# Altium footprint library ESPMODULE.PcbLib: 6 footprints
Each footprint in its own frame and in the unit in brackets; x right, y up, seen from the top. Pads: shape width x height; smd on the part's side, far side on the other; paste and mask are expansions set on the pad; w line width, h text height; cw(c..) or ccw(c..) is an arc to the next point about the centre after c.
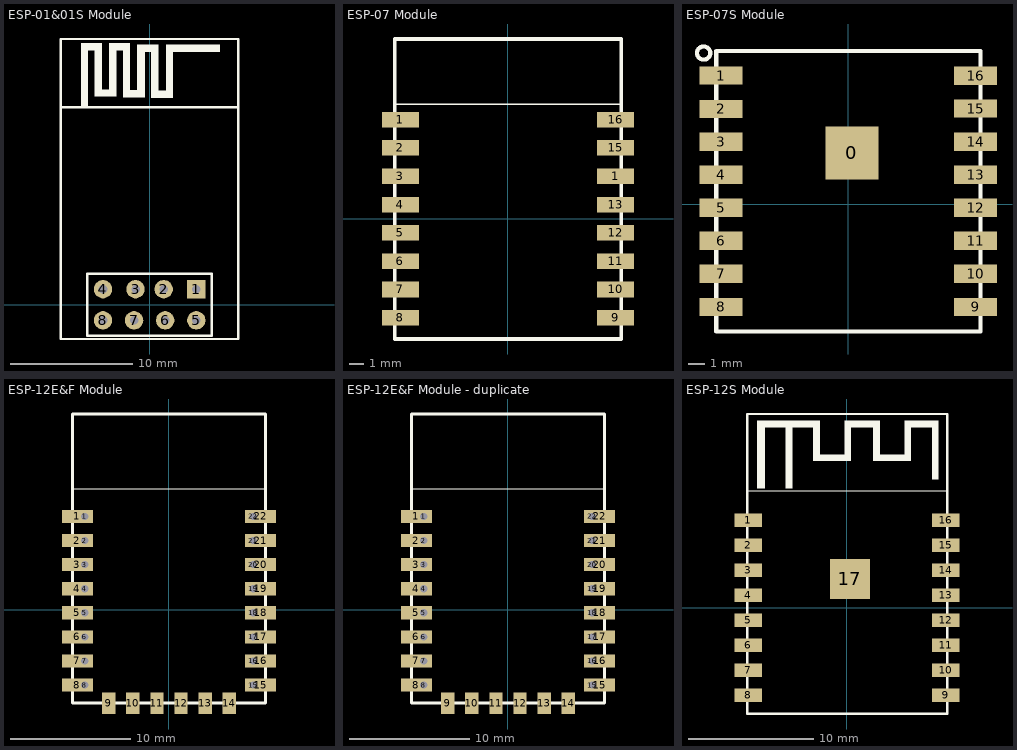
[diagram p0: the footprints below, top view; thin cyan lines are the x and y axes]

## ESP-01&01S Module [mm]
pads (8):
  rect 1.5x1.5 hole 0.7: 1(3.81,1.27)
  round 1.5 hole 0.7: 2(1.15,1.27) 3(-1.15,1.27) 4(-3.81,1.27) 5(3.81,-1.27) 6(1.27,-1.27) 7(-1.27,-1.27) 8(-3.81,-1.27)
Top Overlay:
  rectangle: -5.599,16.129 -5.015,21.361
  rectangle: -5.015,20.777 -3.897,21.361
  rectangle: -4.507,17.018 -3.897,20.777
  rectangle: -3.897,17.018 -2.703,17.602
  rectangle: -3.313,17.602 -2.703,21.361
  rectangle: -2.703,20.777 -1.586,21.361
  rectangle: -2.17,16.942 -1.586,20.777
  rectangle: -1.586,16.942 -0.392,17.526
  rectangle: -1.027,17.526 -0.392,21.26
  rectangle: -0.392,20.65 0.726,21.26
  rectangle: 0.116,16.891 0.726,20.65
  rectangle: 0.726,16.891 1.919,17.501
  rectangle: 1.335,17.501 1.919,21.26
  rectangle: 1.919,20.65 5.755,21.26
  lines w0.2: -7.25,16.129 7.25,16.129 ; -7.25,-2.794 7.25,-2.794 7.25,21.706 -7.25,21.706 -7.25,-2.794 ; -5.08,-2.54 -5.08,2.54 5.08,2.54 5.08,-2.54 -5.08,-2.54

## ESP-07 Module [mm]
pads (16):
  rect 2.6x1.1 smd: 1(-7.6,7) 1(7.6,3) 2(-7.6,5) 3(-7.6,3) 4(-7.6,1) 5(-7.6,-1) 6(-7.6,-3) 7(-7.6,-5) 8(-7.6,-7) 9(7.6,-7) 10(7.6,-5) 11(7.6,-3) 12(7.6,-1) 13(7.6,1) 15(7.6,5) 16(7.6,7)
Top Overlay:
  lines w0.1: -8,8.1 8,8.1
  lines w0.254: -8,-8.5 8,-8.5 8,12.7 -8,12.7 -8,-8.5
3D body "User Library-ESP-07.step": height 3.5, standoff -0.01, extent -7.935,-8.717 8.065,13.283

## ESP-07S Module [mm]
pads (17):
  rect 3.2x3.2 smd: 0(0.22,3.092)
  rect 2.6x1.1 smd: 1(-7.7,7.775) 2(-7.7,5.762) 3(-7.7,3.775) 4(-7.7,1.775) 5(-7.7,-0.225) 6(-7.7,-2.225) 7(-7.7,-4.225) 8(-7.7,-6.225) 9(7.7,-6.225) 10(7.7,-4.225) 11(7.7,-2.225) 12(7.7,-0.225) 13(7.7,1.775) 14(7.7,3.775) 15(7.7,5.775) 16(7.7,7.769)
Top Overlay:
  circle w0.254: c-8.763,9.144 r0.402
  lines w0.254: -8,-7.725 -8,9.275 8,9.275 8,-7.725 -8,-7.725

## ESP-12E&F Module [mm]
pads (38):
  rect 2.6x1.1 smd: 1(-7.6,7.75) 2(-7.6,5.75) 3(-7.6,3.75) 4(-7.6,1.75) 5(-7.6,-0.25) 6(-7.6,-2.25) 7(-7.6,-4.25) 8(-7.6,-6.25) 15(7.6,-6.25) 16(7.6,-4.25) 17(7.6,-2.25) 18(7.6,-0.25) 19(7.6,1.75) 20(7.6,3.75) 21(7.6,5.75) 22(7.6,7.75)
  rect 0.762x1 hole 0.6: 1(-7,7.75) 7(-7,-4.25)
  rect 0.762x1 / inner rect 0.762x1 / far side rect 1x1 hole 0.6: 2(-7,5.75) 3(-7,3.75) 4(-7,1.75) 5(-7,-0.25) 6(-7,-2.25) 8(-7,-6.25) 15(7,-6.25) 16(7,-4.25) 17(7,-2.25) 18(7,-0.25) 19(7,1.75) 20(7,3.75) 21(7,5.75) 22(7,7.75)
  rect 1.1x1.8 smd: 9(-5,-7.75) 10(-3,-7.75) 11(-1,-7.75) 12(1,-7.75) 13(3,-7.75) 14(5,-7.75)
Top Overlay:
  lines w0.1: -8,10.05 8,10.05
  lines w0.254: -8,-7.75 -8,16.25 8,16.25 8,-7.75 -8,-7.75
3D body "User Library-LED-0603-W.step": height 1.25, standoff 0.65, extent 5.169,9.887 6.769,10.687
3D body "User Library-EPS8266 ESP-12E-1.step": height 2.65, standoff -0.04, extent -8.007,-7.766 8.003,16.239

## ESP-12E&F Module - duplicate [mm]
pads (38):
  rect 2.6x1.1 smd: 1(-7.6,7.75) 2(-7.6,5.75) 3(-7.6,3.75) 4(-7.6,1.75) 5(-7.6,-0.25) 6(-7.6,-2.25) 7(-7.6,-4.25) 8(-7.6,-6.25) 15(7.6,-6.25) 16(7.6,-4.25) 17(7.6,-2.25) 18(7.6,-0.25) 19(7.6,1.75) 20(7.6,3.75) 21(7.6,5.75) 22(7.6,7.75)
  rect 0.762x1 hole 0.6: 1(-7,7.75) 7(-7,-4.25)
  rect 0.762x1 / inner rect 0.762x1 / far side rect 1x1 hole 0.6: 2(-7,5.75) 3(-7,3.75) 4(-7,1.75) 5(-7,-0.25) 6(-7,-2.25) 8(-7,-6.25) 15(7,-6.25) 16(7,-4.25) 17(7,-2.25) 18(7,-0.25) 19(7,1.75) 20(7,3.75) 21(7,5.75) 22(7,7.75)
  rect 1.1x1.8 smd: 9(-5,-7.75) 10(-3,-7.75) 11(-1,-7.75) 12(1,-7.75) 13(3,-7.75) 14(5,-7.75)
Top Overlay:
  lines w0.1: -8,10.05 8,10.05
  lines w0.254: -8,-7.75 8,-7.75 8,16.25 -8,16.25 -8,-7.75
3D body "User Library-ESP8266-12E.STEP": height 3.4, standoff 0.4, extent -7.997,-7.934 8.003,16.446

## ESP-12S Module [mm]
pads (17):
  rect 2.2x1.1 smd: 1(-7.9,7) 2(-7.9,5) 3(-7.9,3) 4(-7.9,1) 5(-7.9,-1) 6(-7.9,-3) 7(-7.9,-5) 8(-7.9,-7) 9(7.9,-7) 10(7.9,-5) 11(7.9,-3) 12(7.9,-1) 13(7.9,1) 14(7.9,3) 15(7.9,5) 16(7.9,7)
  rect 3.2x3.2 smd: 17(0.22,2.321)
Top Overlay:
  region: -7.196,14.716 -7.196,9.563 -6.569,9.563 -6.569,14.716
  region: -7.196,14.463 -7.196,14.963 -2.196,14.963 -2.196,12.263 -0.196,12.263 -0.196,14.963 2.604,14.963 2.604,12.263 4.604,12.263 4.604,14.963 7.304,14.963 7.304,10.29 6.804,10.29 6.804,14.463 5.104,14.463 5.104,11.763 2.104,11.763 2.104,14.463 0.304,14.463 0.304,11.763 -2.696,11.763 -2.696,14.463 -4.396,14.463 -4.396,9.563 -4.896,9.563 -4.896,14.463
  lines w0.1: -8,9.354 8,9.354
  lines w0.2: -8,-8.496 -8,15.504 8,15.504 8,-8.496 -8,-8.496
3D body "User Library-esp-12s.step": height 3.15, standoff 0.03, extent -8,-8.571 8,15.429